# Altium footprint library MH_DA_THU_VIEN_16122016.PcbLib: 531 footprints (part 14 of 34)
Each footprint in its own frame and in the unit in brackets; x right, y up, seen from the top. Pads: shape width x height; smd on the part's side, far side on the other; paste and mask are expansions set on the pad; w line width, h text height; cw(c..) or ccw(c..) is an arc to the next point about the centre after c.
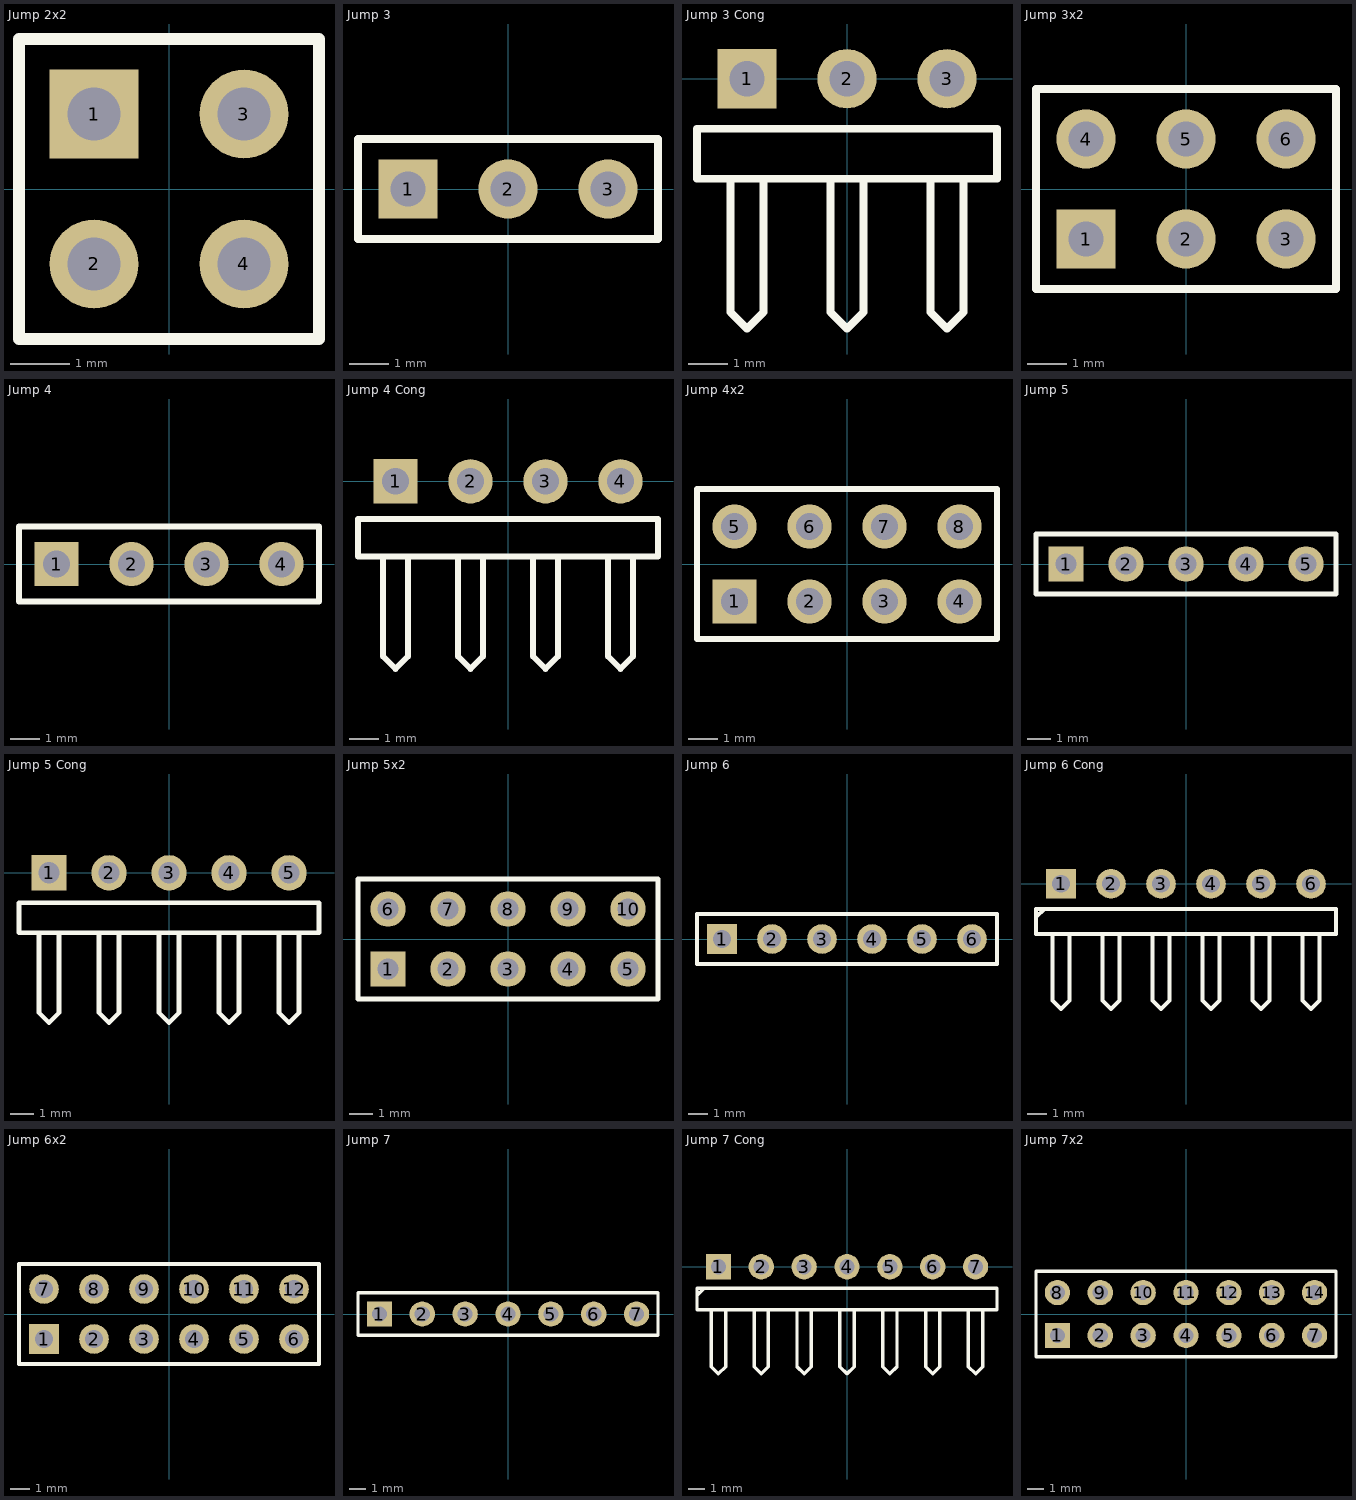
[diagram p13: the footprints below, top view; thin cyan lines are the x and y axes]

## Jump 2x2 [mm]
pads (4):
  rect 1.5x1.5 hole 0.9: 1(-1.27,1.27)
  round 1.5 hole 0.9: 2(-1.27,-1.27) 3(1.27,1.27) 4(1.27,-1.27)
Top Overlay:
  lines w0.2: -2.54,-2.54 2.54,-2.54 2.54,2.54 -2.54,2.54 -2.54,-2.54
3D body: height 7, standoff -1, extent -1.676,0.88 -0.878,1.676
3D body: height 7, standoff -1, extent -1.676,-1.66 -0.878,-0.864
3D body: height 7, standoff -1, extent 0.864,0.88 1.662,1.676
3D body: height 7, standoff -1, extent 0.864,-1.66 1.662,-0.864
3D body: height 1.5, standoff 0, extent -2.54,-2.54 0,0
3D body: height 1.5, standoff 0, extent -2.54,0 0,2.54
3D body: height 1.5, standoff 0, extent 0,-2.54 2.54,0
3D body: height 1.5, standoff 0, extent 0,0 2.54,2.54

## Jump 3 [mm] "Jump 3P 2.54"
pads (3):
  rect 1.5x1.5 hole 0.9: 1(-2.54,0)
  round 1.5 hole 0.9: 2(0,0) 3(2.54,0)
Top Overlay:
  lines w0.2: -3.81,-1.27 -3.81,1.27 ; -3.81,-1.27 3.81,-1.27 3.81,1.27 -3.81,1.27 ; -3.81,-1.27 -3.81,1.27
3D body: height 1.5, standoff 0, extent -3.81,-1.27 -1.27,1.27
3D body: height 7, standoff -1, extent -2.946,-0.406 -2.15,0.392
3D body: height 1.5, standoff 0, extent -1.27,-1.27 1.27,1.27
3D body: height 7, standoff -1, extent -0.406,-0.406 0.39,0.392
3D body: height 1.5, standoff 0, extent 1.27,-1.27 3.81,1.27
3D body: height 7, standoff -1, extent 2.134,-0.406 2.93,0.392

## Jump 3 Cong [mm]
pads (3):
  rect 1.5x1.5 hole 0.9: 1(-2.54,0)
  round 1.5 hole 0.9: 2(0,0) 3(2.54,0)
Top Overlay:
  lines w0.2: -2.963,-2.54 -2.963,-5.927 -2.54,-6.35 -2.117,-5.927 -2.117,-2.54 ; -0.423,-2.54 -0.423,-5.927 0,-6.35 0.423,-5.927 0.423,-2.54 ; 2.117,-2.54 2.117,-5.927 2.54,-6.35 2.963,-5.927 2.963,-2.54 ; -3.81,-2.54 3.81,-2.54 3.81,-1.27 -3.81,-1.27 -3.81,-2.54
3D body: height 4.33, standoff -3, extent -3.81,-7 3.81,1.27

## Jump 3x2 [mm]
pads (6):
  rect 1.5x1.5 hole 0.9: 1(-2.54,-1.27)
  round 1.5 hole 0.9: 2(0,-1.27) 3(2.54,-1.27) 4(-2.54,1.27) 5(0,1.27) 6(2.54,1.27)
Top Overlay:
  lines w0.2: -1.058,-2.54 3.81,-2.54 ; 3.81,-2.54 3.81,2.54 -3.81,2.54 -3.81,-2.54 3.81,-2.54
3D body: height 7, standoff -1, extent 2.148,-1.676 2.946,-0.88
3D body: height 7, standoff -1, extent 2.148,0.864 2.946,1.66
3D body: height 7, standoff -1, extent -0.392,-1.676 0.406,-0.88
3D body: height 7, standoff -1, extent -0.392,0.864 0.406,1.66
3D body: height 7, standoff -1, extent -2.932,-1.676 -2.134,-0.88
3D body: height 7, standoff -1, extent -2.932,0.864 -2.134,1.66
3D body: height 1.5, standoff 0, extent -3.81,-2.54 -1.27,0
3D body: height 1.5, standoff 0, extent -1.27,-2.54 1.27,0
3D body: height 1.5, standoff 0, extent 1.27,-2.54 3.81,0
3D body: height 1.5, standoff 0, extent 1.27,0 3.81,2.54
3D body: height 1.5, standoff 0, extent -1.27,0 1.27,2.54
3D body: height 1.5, standoff 0, extent -3.81,0 -1.27,2.54

## Jump 4 [mm]
pads (4):
  rect 1.5x1.5 hole 0.9: 1(-3.81,0)
  round 1.5 hole 0.9: 2(-1.27,0) 3(1.27,0) 4(3.81,0)
Top Overlay:
  lines w0.2: -5.08,-1.27 5.08,-1.27 5.08,1.27 -5.08,1.27 -5.08,-1.27
3D body: height 1.5, standoff 0, extent 2.54,-1.27 5.08,1.27
3D body: height 7, standoff -1, extent 3.404,-0.406 4.2,0.392
3D body: height 1.5, standoff 0, extent 0,-1.27 2.54,1.27
3D body: height 7, standoff -1, extent 0.864,-0.406 1.66,0.392
3D body: height 1.5, standoff 0, extent -2.54,-1.27 0,1.27
3D body: height 7, standoff -1, extent -1.676,-0.406 -0.88,0.392
3D body: height 1.5, standoff 0, extent -5.08,-1.27 -2.54,1.27
3D body: height 7, standoff -1, extent -4.216,-0.406 -3.42,0.392

## Jump 4 Cong [mm]
pads (4):
  rect 1.5x1.5 hole 0.9: 1(-3.81,0)
  round 1.5 hole 0.9: 2(-1.27,0) 3(1.27,0) 4(3.81,0)
Top Overlay:
  lines w0.2: -4.233,-2.54 -4.233,-5.927 -3.81,-6.35 -3.387,-5.927 -3.387,-2.54 ; -1.693,-2.54 -1.693,-5.927 -1.27,-6.35 -0.847,-5.927 -0.847,-2.54 ; 0.847,-2.54 0.847,-5.927 1.27,-6.35 1.693,-5.927 1.693,-2.54 ; 3.387,-2.54 3.387,-5.927 3.81,-6.35 4.233,-5.927 4.233,-2.54 ; -5.08,-2.54 -5.08,-1.27 5.08,-1.27 5.08,-2.54 -5.08,-2.54
3D body: height 4.33, standoff -3, extent 0,-7 5.08,1.27
3D body: height 4.33, standoff -3, extent -5.08,-7 0,1.27

## Jump 4x2 [mm]
pads (8):
  rect 1.5x1.5 hole 0.9: 1(-3.81,-1.27)
  round 1.5 hole 0.9: 2(-1.27,-1.27) 3(1.27,-1.27) 4(3.81,-1.27) 5(-3.81,1.27) 6(-1.27,1.27) 7(1.27,1.27) 8(3.81,1.27)
Top Overlay:
  lines w0.2: -5.08,-2.54 -5.08,2.54 5.08,2.54 5.08,-2.54 -5.08,-2.54
3D body: height 1.5, standoff 0, extent -5.08,0 -2.54,2.54
3D body: height 1.5, standoff 0, extent -2.54,0 0,2.54
3D body: height 1.5, standoff 0, extent 0,0 2.54,2.54
3D body: height 1.5, standoff 0, extent 2.54,0 5.08,2.54
3D body: height 1.5, standoff 0, extent 2.54,-2.54 5.08,0
3D body: height 1.5, standoff 0, extent 0,-2.54 2.54,0
3D body: height 1.5, standoff 0, extent -2.54,-2.54 0,0
3D body: height 1.5, standoff 0, extent -5.08,-2.54 -2.54,0
3D body: height 7, standoff -1, extent -4.202,0.864 -3.404,1.66
3D body: height 7, standoff -1, extent -4.202,-1.676 -3.404,-0.88
3D body: height 7, standoff -1, extent -1.662,0.864 -0.864,1.66
3D body: height 7, standoff -1, extent -1.662,-1.676 -0.864,-0.88
3D body: height 7, standoff -1, extent 0.878,0.864 1.676,1.66
3D body: height 7, standoff -1, extent 0.878,-1.676 1.676,-0.88
3D body: height 7, standoff -1, extent 3.418,0.864 4.216,1.66
3D body: height 7, standoff -1, extent 3.418,-1.676 4.216,-0.88

## Jump 5 [mm]
pads (5):
  rect 1.5x1.5 hole 0.9: 1(-5.08,0)
  round 1.5 hole 0.9: 2(-2.54,0) 3(0,0) 4(2.54,0) 5(5.08,0)
Top Overlay:
  lines w0.2: -6.35,-1.27 -6.35,1.27 6.35,1.27 6.35,-1.27 -6.35,-1.27
3D body: height 7, standoff -1, extent -5.486,-0.406 -4.69,0.392
3D body: height 1.5, standoff 0, extent -6.35,-1.27 -3.81,1.27
3D body: height 7, standoff -1, extent -2.946,-0.406 -2.15,0.392
3D body: height 1.5, standoff 0, extent -3.81,-1.27 -1.27,1.27
3D body: height 7, standoff -1, extent -0.406,-0.406 0.39,0.392
3D body: height 1.5, standoff 0, extent -1.27,-1.27 1.27,1.27
3D body: height 7, standoff -1, extent 2.134,-0.406 2.93,0.392
3D body: height 1.5, standoff 0, extent 1.27,-1.27 3.81,1.27
3D body: height 7, standoff -1, extent 4.674,-0.406 5.47,0.392
3D body: height 1.5, standoff 0, extent 3.81,-1.27 6.35,1.27

## Jump 5 Cong [mm]
pads (5):
  rect 1.5x1.5 hole 0.9: 1(-5.08,0)
  round 1.5 hole 0.9: 2(-2.54,0) 3(0,0) 4(2.54,0) 5(5.08,0)
Top Overlay:
  lines w0.2: -5.503,-2.54 -5.503,-5.927 -5.08,-6.35 -4.657,-5.927 -4.657,-2.54 ; -2.963,-2.54 -2.963,-5.927 -2.54,-6.35 -2.117,-5.927 -2.117,-2.54 ; -0.423,-2.54 -0.423,-5.927 0,-6.35 0.423,-5.927 0.423,-2.54 ; 2.117,-2.54 2.117,-5.927 2.54,-6.35 2.963,-5.927 2.963,-2.54 ; 4.657,-2.54 4.657,-5.927 5.08,-6.35 5.503,-5.927 5.503,-2.54 ; -6.35,-2.54 -6.35,-1.27 6.35,-1.27 6.35,-2.54 -6.35,-2.54
3D body: height 4.33, standoff -3, extent -6.35,-7.127 1.27,1.143
3D body: height 4.33, standoff -3, extent 1.27,-7.127 6.35,1.143

## Jump 5x2 [mm]
pads (10):
  rect 1.5x1.5 hole 0.9: 1(-5.08,-1.27)
  round 1.5 hole 0.9: 2(-2.54,-1.27) 3(0,-1.27) 4(2.54,-1.27) 5(5.08,-1.27) 6(-5.08,1.27) 7(-2.54,1.27) 8(0,1.27) 9(2.54,1.27) 10(5.08,1.27)
Top Overlay:
  lines w0.2: -6.35,-2.54 6.35,-2.54 6.35,2.54 -6.35,2.54 -6.35,-2.54
3D body: height 7, standoff -1, extent 4.688,-1.676 5.486,-0.88
3D body: height 7, standoff -1, extent 4.688,0.864 5.486,1.66
3D body: height 7, standoff -1, extent 2.148,-1.676 2.946,-0.88
3D body: height 7, standoff -1, extent 2.148,0.864 2.946,1.66
3D body: height 7, standoff -1, extent -0.392,-1.676 0.406,-0.88
3D body: height 7, standoff -1, extent -0.392,0.864 0.406,1.66
3D body: height 7, standoff -1, extent -2.932,-1.676 -2.134,-0.88
3D body: height 7, standoff -1, extent -2.932,0.864 -2.134,1.66
3D body: height 7, standoff -1, extent -5.472,-1.676 -4.674,-0.88
3D body: height 7, standoff -1, extent -5.472,0.864 -4.674,1.66
3D body: height 1.5, standoff 0, extent -6.35,0 -3.81,2.54
3D body: height 1.5, standoff 0, extent -3.81,0 -1.27,2.54
3D body: height 1.5, standoff 0, extent -1.27,0 1.27,2.54
3D body: height 1.5, standoff 0, extent 1.27,0 3.81,2.54
3D body: height 1.5, standoff 0, extent 3.81,0 6.35,2.54
3D body: height 1.5, standoff 0, extent 3.81,-2.54 6.35,0
3D body: height 1.5, standoff 0, extent 1.27,-2.54 3.81,0
3D body: height 1.5, standoff 0, extent -1.27,-2.54 1.27,0
3D body: height 1.5, standoff 0, extent -3.81,-2.54 -1.27,0
3D body: height 1.5, standoff 0, extent -6.35,-2.54 -3.81,0

## Jump 6 [mm]
pads (6):
  rect 1.5x1.5 hole 0.9: 1(-6.35,0)
  round 1.5 hole 0.9: 2(-3.81,0) 3(-1.27,0) 4(1.27,0) 5(3.81,0) 6(6.35,0)
Top Overlay:
  lines w0.2: -7.62,-1.27 7.62,-1.27 7.62,1.27 -7.62,1.27 -7.62,-1.27
3D body: height 7, standoff -1, extent 5.944,-0.406 6.74,0.392
3D body: height 1.5, standoff 0, extent 5.08,-1.27 7.62,1.27
3D body: height 7, standoff -1, extent -6.756,-0.406 -5.96,0.392
3D body: height 1.5, standoff 0, extent -7.62,-1.27 -5.08,1.27
3D body: height 7, standoff -1, extent -4.216,-0.406 -3.42,0.392
3D body: height 1.5, standoff 0, extent -5.08,-1.27 -2.54,1.27
3D body: height 7, standoff -1, extent -1.676,-0.406 -0.88,0.392
3D body: height 1.5, standoff 0, extent -2.54,-1.27 0,1.27
3D body: height 7, standoff -1, extent 0.864,-0.406 1.66,0.392
3D body: height 1.5, standoff 0, extent 0,-1.27 2.54,1.27
3D body: height 7, standoff -1, extent 3.404,-0.406 4.2,0.392
3D body: height 1.5, standoff 0, extent 2.54,-1.27 5.08,1.27

## Jump 6 Cong [mm]
pads (6):
  rect 1.5x1.5 hole 0.9: 1(-6.35,0)
  round 1.5 hole 0.9: 2(-3.81,0) 3(-1.27,0) 4(1.27,0) 5(3.81,0) 6(6.35,0)
Top Overlay:
  lines w0.2: -7.62,-1.693 -7.197,-1.27 ; -6.773,-2.54 -6.773,-5.927 -6.35,-6.35 -5.927,-5.927 -5.927,-2.54 ; -4.233,-2.54 -4.233,-5.927 -3.81,-6.35 -3.387,-5.927 -3.387,-2.54 ; -1.693,-2.54 -1.693,-5.927 -1.27,-6.35 -0.847,-5.927 -0.847,-2.54 ; 0.847,-2.54 0.847,-5.927 1.27,-6.35 1.693,-5.927 1.693,-2.54 ; 3.387,-2.54 3.387,-5.927 3.81,-6.35 4.233,-5.927 4.233,-2.54 ; 5.927,-2.54 5.927,-5.927 6.35,-6.35 6.773,-5.927 6.773,-2.54 ; -7.62,-2.54 7.62,-2.54 7.62,-1.27 -7.62,-1.27 -7.62,-2.54
3D body: height 4.33, standoff -3, extent -7.62,-7 -2.54,1.27
3D body: height 4.33, standoff -3, extent -2.54,-7 2.54,1.27
3D body: height 4.33, standoff -3, extent 2.54,-7 7.62,1.27

## Jump 6x2 [mm]
pads (12):
  rect 1.5x1.5 hole 0.9: 1(-6.35,-1.27)
  round 1.5 hole 0.9: 2(-3.81,-1.27) 3(-1.27,-1.27) 4(1.27,-1.27) 5(3.81,-1.27) 6(6.35,-1.27) 7(-6.35,1.27) 8(-3.81,1.27) 9(-1.27,1.27) 10(1.27,1.27) 11(3.81,1.27) 12(6.35,1.27)
Top Overlay:
  lines w0.2: -7.62,-2.54 -7.62,2.54 7.62,2.54 7.62,-2.54 -7.62,-2.54
3D body: height 1.5, standoff 0, extent -7.62,-2.54 -5.08,0
3D body: height 1.5, standoff 0, extent -7.62,0 -5.08,2.54
3D body: height 1.5, standoff 0, extent -5.08,-2.54 -2.54,0
3D body: height 1.5, standoff 0, extent -5.08,0 -2.54,2.54
3D body: height 1.5, standoff 0, extent -2.54,-2.54 0,0
3D body: height 1.5, standoff 0, extent -2.54,0 0,2.54
3D body: height 1.5, standoff 0, extent 0,-2.54 2.54,0
3D body: height 1.5, standoff 0, extent 0,0 2.54,2.54
3D body: height 1.5, standoff 0, extent 2.54,-2.54 5.08,0
3D body: height 1.5, standoff 0, extent 2.54,0 5.08,2.54
3D body: height 1.5, standoff 0, extent 5.08,-2.54 7.62,0
3D body: height 1.5, standoff 0, extent 5.08,0 7.62,2.54
3D body: height 7, standoff -1, extent -6.742,0.864 -5.944,1.66
3D body: height 7, standoff -1, extent -6.742,-1.676 -5.944,-0.88
3D body: height 7, standoff -1, extent -4.202,0.864 -3.404,1.66
3D body: height 7, standoff -1, extent -4.202,-1.676 -3.404,-0.88
3D body: height 7, standoff -1, extent -1.662,0.864 -0.864,1.66
3D body: height 7, standoff -1, extent -1.662,-1.676 -0.864,-0.88
3D body: height 7, standoff -1, extent 0.878,0.864 1.676,1.66
3D body: height 7, standoff -1, extent 0.878,-1.676 1.676,-0.88

## Jump 7 [mm]
pads (7):
  rect 1.5x1.5 hole 0.9: 1(-7.62,0)
  round 1.5 hole 0.9: 2(-5.08,0) 3(-2.54,0) 4(0,0) 5(2.54,0) 6(5.08,0) 7(7.62,0)
Top Overlay:
  lines w0.2: -8.89,-1.27 8.89,-1.27 8.89,1.27 -8.89,1.27 -8.89,-1.27
3D body: height 1.5, standoff 0, extent 1.27,-1.27 3.81,1.27
3D body: height 7, standoff -1, extent 2.134,-0.406 2.93,0.392
3D body: height 1.5, standoff 0, extent -1.27,-1.27 1.27,1.27
3D body: height 7, standoff -1, extent -0.406,-0.406 0.39,0.392
3D body: height 1.5, standoff 0, extent -3.81,-1.27 -1.27,1.27
3D body: height 7, standoff -1, extent -2.946,-0.406 -2.15,0.392
3D body: height 1.5, standoff 0, extent -6.35,-1.27 -3.81,1.27
3D body: height 7, standoff -1, extent -5.486,-0.406 -4.69,0.392
3D body: height 1.5, standoff 0, extent -8.89,-1.27 -6.35,1.27
3D body: height 7, standoff -1, extent -8.026,-0.406 -7.23,0.392
3D body: height 1.5, standoff 0, extent 6.35,-1.27 8.89,1.27
3D body: height 7, standoff -1, extent 7.214,-0.406 8.01,0.392
3D body: height 1.5, standoff 0, extent 3.81,-1.27 6.35,1.27
3D body: height 7, standoff -1, extent 4.674,-0.406 5.47,0.392

## Jump 7 Cong [mm]
pads (7):
  rect 1.5x1.5 hole 0.9: 1(-7.62,0)
  round 1.5 hole 0.9: 2(-5.08,0) 3(-2.54,0) 4(0,0) 5(2.54,0) 6(5.08,0) 7(7.62,0)
Top Overlay:
  lines w0.2: -8.89,-1.693 -8.467,-1.27 ; -8.043,-2.54 -8.043,-5.927 -7.62,-6.35 -7.197,-5.927 -7.197,-2.54 ; -5.503,-2.54 -5.503,-5.927 -5.08,-6.35 -4.657,-5.927 -4.657,-2.54 ; -2.963,-2.54 -2.963,-5.927 -2.54,-6.35 -2.117,-5.927 -2.117,-2.54 ; -0.423,-2.54 -0.423,-5.927 0,-6.35 0.423,-5.927 0.423,-2.54 ; 2.117,-2.54 2.117,-5.927 2.54,-6.35 2.963,-5.927 2.963,-2.54 ; 4.657,-2.54 4.657,-5.927 5.08,-6.35 5.503,-5.927 5.503,-2.54 ; 7.197,-2.54 7.197,-5.927 7.62,-6.35 8.043,-5.927 8.043,-2.54 ; -8.89,-2.54 8.89,-2.54 8.89,-1.27 -8.89,-1.27 -8.89,-2.54
3D body: height 4.33, standoff -3, extent 1.27,-7 8.89,1.27
3D body: height 4.33, standoff -3, extent -3.81,-7 1.27,1.27
3D body: height 4.33, standoff -3, extent -8.89,-7 -3.81,1.27

## Jump 7x2 [mm]
pads (14):
  rect 1.5x1.5 hole 0.9: 1(-7.62,-1.27)
  round 1.5 hole 0.9: 2(-5.08,-1.27) 3(-2.54,-1.27) 4(0,-1.27) 5(2.54,-1.27) 6(5.08,-1.27) 7(7.62,-1.27) 8(-7.62,1.27) 9(-5.08,1.27) 10(-2.54,1.27) 11(0,1.27) 12(2.54,1.27) 13(5.08,1.27) 14(7.62,1.27)
Top Overlay:
  lines w0.2: -8.89,-2.54 8.89,-2.54 8.89,2.54 -8.89,2.54 -8.89,-2.54
3D body: height 1.5, standoff 0, extent -8.89,-2.54 -6.35,0
3D body: height 1.5, standoff 0, extent -8.89,0 -6.35,2.54
3D body: height 1.5, standoff 0, extent -6.35,-2.54 -3.81,0
3D body: height 1.5, standoff 0, extent -6.35,0 -3.81,2.54
3D body: height 1.5, standoff 0, extent -3.81,-2.54 -1.27,0
3D body: height 1.5, standoff 0, extent -3.81,0 -1.27,2.54
3D body: height 1.5, standoff 0, extent -1.27,-2.54 1.27,0
3D body: height 1.5, standoff 0, extent -1.27,0 1.27,2.54
3D body: height 1.5, standoff 0, extent 1.27,-2.54 3.81,0
3D body: height 1.5, standoff 0, extent 1.27,0 3.81,2.54
3D body: height 1.5, standoff 0, extent 3.81,-2.54 6.35,0
3D body: height 1.5, standoff 0, extent 3.81,0 6.35,2.54
3D body: height 1.5, standoff 0, extent 6.35,-2.54 8.89,0
3D body: height 1.5, standoff 0, extent 6.35,0 8.89,2.54